# Altium footprint library TriggersLib.PcbLib: 262 footprints (part 7 of 17)
Each footprint in its own frame and in the unit in brackets; x right, y up, seen from the top. Pads: shape width x height; smd on the part's side, far side on the other; paste and mask are expansions set on the pad; w line width, h text height; cw(c..) or ccw(c..) is an arc to the next point about the centre after c.
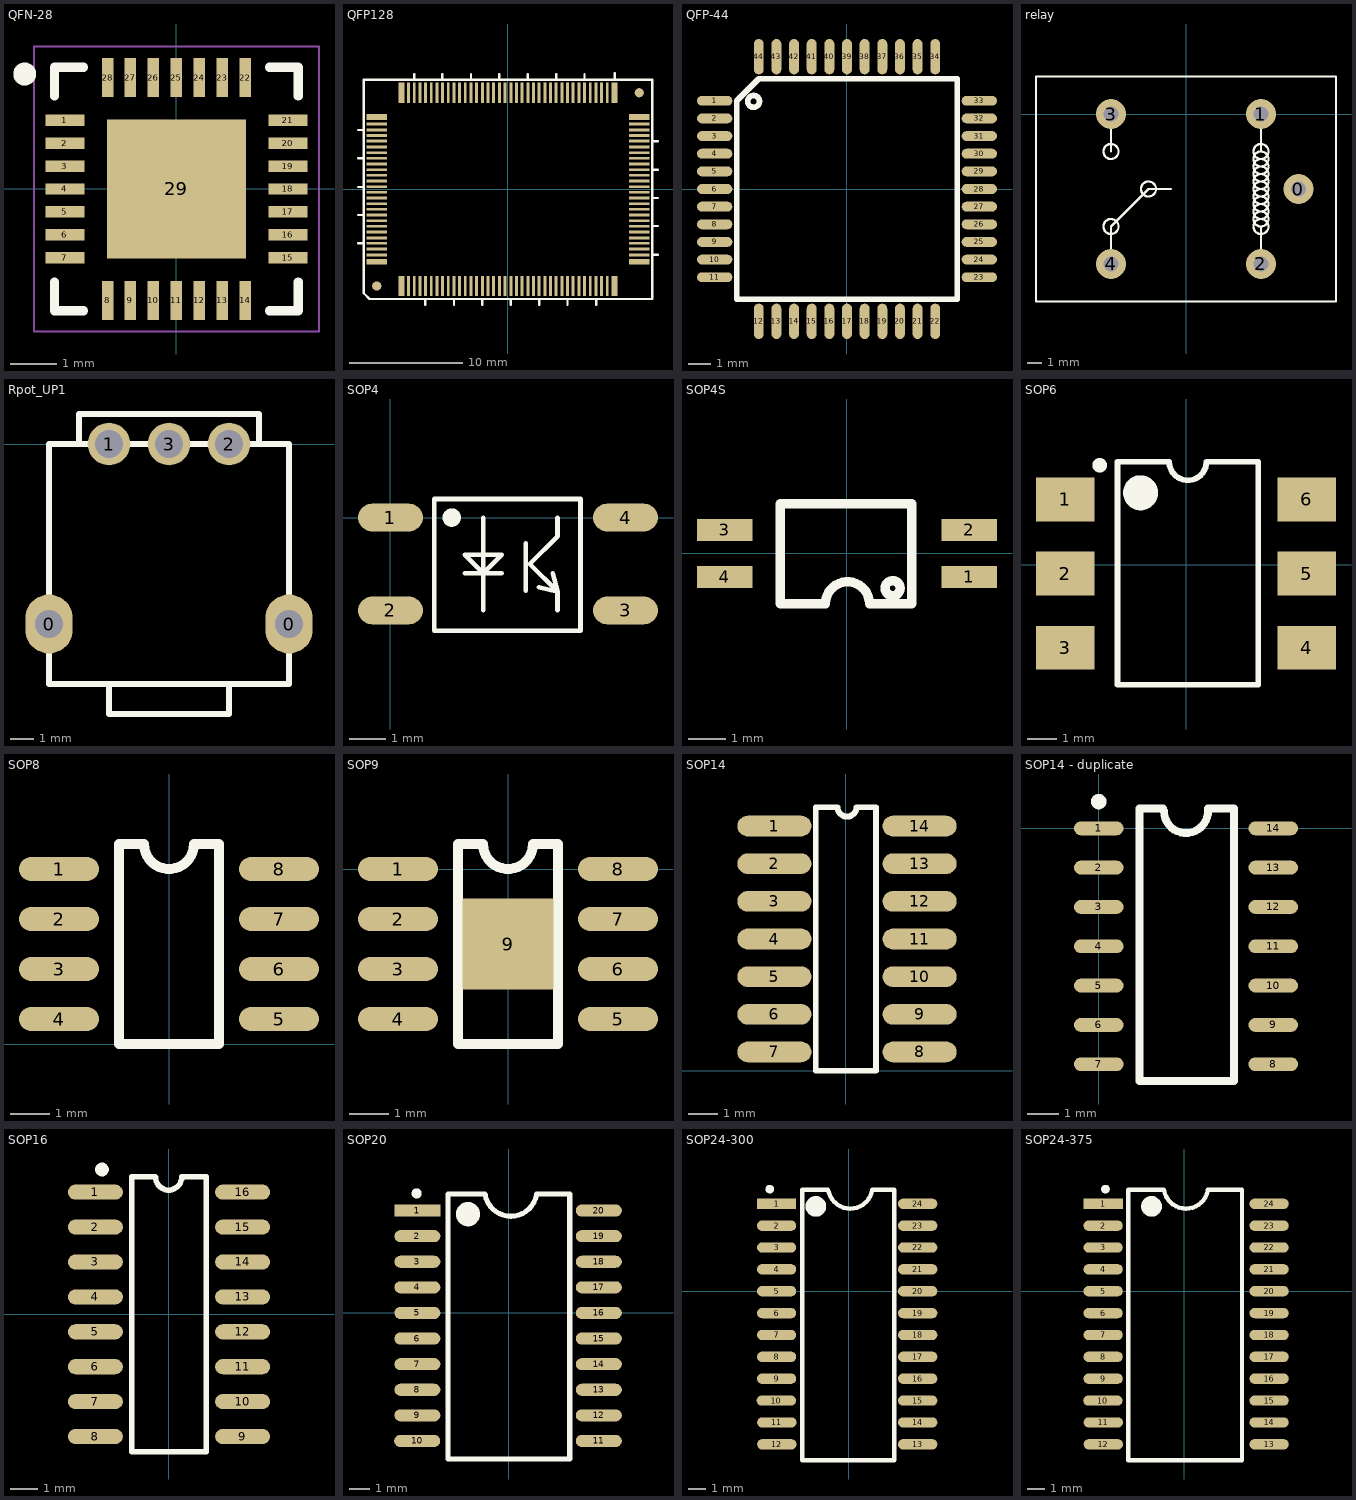
[diagram p6: the footprints below, top view; thin cyan lines are the x and y axes]

## QFN-28 [mm] "QFN, 28-Leads, Body 5.00x5.00mm, Pitch 0.50mm, Thermal Pad 3.03x3.03mm, IPC Medium Density"
height 0.9
pads (29):
  rect 0.85x0.25 smd: 1(-2.425,1.5) 2(-2.425,1) 3(-2.425,0.5) 4(-2.425,0) 5(-2.425,-0.5) 6(-2.425,-1) 7(-2.425,-1.5) 15(2.425,-1.5) 16(2.425,-1) 17(2.425,-0.5) 18(2.425,0) 19(2.425,0.5) 20(2.425,1) 21(2.425,1.5)
  rect 0.25x0.85 smd: 8(-1.5,-2.425) 9(-1,-2.425) 10(-0.5,-2.425) 11(0,-2.425) 12(0.5,-2.425) 13(1,-2.425) 14(1.5,-2.425) 22(1.5,2.425) 23(1,2.425) 24(0.5,2.425) 25(0,2.425) 26(-0.5,2.425) 27(-1,2.425) 28(-1.5,2.425)
  rect 3.03x3.03 smd: 29(0,0)
Top Overlay:
  circle w0.25: c-3.3,2.5 r0.125
  lines w0.2: -2.65,-2.025 -2.65,-2.65 -2.025,-2.65 ; -2.65,2.025 -2.65,2.65 -2.025,2.65 ; 2.025,-2.65 2.65,-2.65 2.65,-2.025 ; 2.025,2.65 2.65,2.65 2.65,2.025
Mechanical 15:
  lines w0.05: -3.1,-3.1 -3.1,3.1 3.1,3.1 3.1,-3.1 -3.1,-3.1
  lines w0.1: -0.5,0 0.5,0 ; 0,-0.5 0,0.5
3D body "User Library-QFN28.STEP": height 0.9, standoff 0, extent -2.5,-2.525 2.54,2.515

## QFP128 [mil]
pads (130):
  rect 20x70 smd: 1(-369,-335) 38(369,-335) 65(369,335) 102(-369,335)
  rect 10x70 smd: 2(-345,-335) 3(-325,-335) 4(-305,-335) 5(-286,-335) 6(-266,-335) 7(-246,-335) 8(-227,-335) 9(-207,-335) 10(-187,-335) 11(-168,-335) 12(-148,-335) 13(-128,-335) 14(-109,-335) 15(-89,-335) 16(-69,-335) 17(-50,-335) 18(-30,-335) 19(-10,-335) 20(10,-335) 21(29,-335) 22(49,-335) 23(69,-335) 24(88,-335) 25(108,-335) 26(128,-335) 27(147,-335) 28(167,-335) 29(187,-335) 30(206,-335) 31(226,-335) 32(246,-335) 33(265,-335) 34(285,-335) 35(305,-335) 36(324,-335) 37(344,-335) 66(344,335) 67(324,335) 68(305,335) 69(285,335) 70(265,335) 71(246,335) 72(226,335) 73(206,335) 74(187,335) 75(167,335) 76(147,335) 77(128,335) 78(108,335) 79(88,335) 80(69,335) 81(49,335) 82(29,335) 83(10,335) 84(-10,335) 85(-30,335) 86(-50,335) 87(-69,335) 88(-89,335) 89(-109,335) 90(-128,335) 91(-148,335) 92(-168,335) 93(-187,335) 94(-207,335) 95(-227,335) 96(-246,335) 97(-266,335) 98(-286,335) 99(-305,335) 100(-325,335) 101(-345,335)
  rect 70x20 smd: 39(455,-251) 64(455,251) 103(-455,251) 128(-455,-251)
  rect 70x10 smd: 40(455,-227) 41(455,-207) 42(455,-187) 43(455,-168) 44(455,-148) 45(455,-128) 46(455,-109) 47(455,-89) 48(455,-69) 49(455,-50) 50(455,-30) 51(455,-10) 52(455,9) 53(455,29) 54(455,49) 55(455,68) 56(455,88) 57(455,108) 58(455,127) 59(455,147) 60(455,167) 61(455,187) 62(455,206) 63(455,226) 104(-455,226) 105(-455,206) 106(-455,187) 107(-455,167) 108(-455,147) 109(-455,127) 110(-455,108) 111(-455,88) 112(-455,68) 113(-455,49) 114(-455,29) 115(-455,9) 116(-455,-10) 117(-455,-30) 118(-455,-50) 119(-455,-69) 120(-455,-89) 121(-455,-109) 122(-455,-128) 123(-455,-148) 124(-455,-168) 125(-455,-187) 126(-455,-207) 127(-455,-227)
  round 32 smd: 129(-455,-335) 130(455,335)
Top Overlay:
  lines w8: -520,-187 -500,-187 ; -520,-89 -500,-89 ; -520,8 -500,8 ; -520,108 -500,108 ; -520,205.5 -500,205.5 ; -325,380 -325,400 ; -287,-400 -287,-380 ; -227.5,380 -227.5,400 ; -187,-400 -187,-380 ; -128,380 -128,400 ; -89.5,-400 -89.5,-380 ; -30,380 -30,400 ; 10,-400 10,-380 ; 69,380 69,400 ; 108,-400 108,-380 ; 167.5,380 167.5,400 ; 206,-400 206,-380 ; 265,380 265,400 ; 305.5,-400 305.5,-380 ; 370,382.5 370,402.5 ; 500,-227 520,-227 ; 500,-127 520,-127 ; 500,-30 520,-30 ; 500,68 520,68 ; 500,167 520,167 ; -500,-360 -500,380 500,380 500,-380 -480,-380 -500,-360
3D body "User Library-QFP5-128.step": height 114.17, standoff 0, extent -457.39,-339.17 456,338

## QFP-44 [mm]
pads (44):
  oval 1.6x0.45 smd: 1(-6,4) 2(-6,3.2) 3(-6,2.4) 4(-6,1.6) 5(-6,0.8) 6(-6,0) 7(-6,-0.8) 8(-6,-1.6) 9(-6,-2.4) 10(-6,-3.2) 11(-6,-4) 23(6,-4) 24(6,-3.2) 25(6,-2.4) 26(6,-1.6) 27(6,-0.8) 28(6,0) 29(6,0.8) 30(6,1.6) 31(6,2.4) 32(6,3.2) 33(6,4)
  oval 0.45x1.6 smd: 12(-4,-6) 13(-3.2,-6) 14(-2.4,-6) 15(-1.6,-6) 16(-0.8,-6) 17(0,-6) 18(0.8,-6) 19(1.6,-6) 20(2.4,-6) 21(3.2,-6) 22(4,-6) 34(4,6) 35(3.2,6) 36(2.4,6) 37(1.6,6) 38(0.8,6) 39(0,6) 40(-0.8,6) 41(-1.6,6) 42(-2.4,6) 43(-3.2,6) 44(-4,6)
Top Overlay:
  circle w0.254: c-4.232,3.972 r0.267
  lines w0.254: -5,-5 5,-5 5,5 -4,5 -5,4 -5,-5
3D body "User Library-44 pin tqfp ic package.STEP": height 1.1, standoff -0.01, extent -5.975,-5.975 6.025,6.025
3D body: height 1.15, standoff 0, extent -4.484,3.489 -3.488,4.487

## relay [mil]
pads (5):
  round 80 hole 40: 0(300,-200) 1(200,0) 2(200,-400) 3(-200,0) 4(-200,-400)
Top Overlay:
  circle w6: c200,-300 r20
  circle w6: c200,-280 r20
  circle w6: c200,-260 r20
  circle w6: c200,-240 r20
  circle w6: c200,-220 r20
  circle w6: c200,-200 r20
  circle w6: c200,-180 r20
  circle w6: c200,-160 r20
  circle w6: c200,-140 r20
  circle w6: c200,-120 r20
  circle w6: c200,-100 r20
  circle w6: c-100,-200 r20
  circle w6: c-200,-300 r20
  circle w6: c-200,-100 r20
  lines w6: -200,-400 -200,-300 -100,-200 -40,-200 ; -200,-100 -200,0 ; 200,-400 200,-300 ; 200,-100 200,0 ; -400,-500 -400,100 400,100 400,-500 -400,-500

## Rpot_UP1 [mm]
pads (5):
  oval 2x2.5 hole 1.2: 0(-20.32,-7.62) 0(-10.16,-7.62)
  round 1.8 hole 1.2: 1(-17.78,0) 2(-12.7,0) 3(-15.24,0)
Top Overlay:
  lines w0.254: -19.05,0 -19.05,1.27 -11.43,1.27 -11.43,0 ; -17.78,-10.16 -17.78,-11.43 -13.97,-11.43 -12.7,-11.43 -12.7,-10.16 ; -20.32,-10.16 -20.32,0 -10.16,0 -10.16,-10.16 -20.32,-10.16

## SOP4 [mil] "AQY211G2S"
pads (4):
  oval 70x30 smd: 1(0,0) 2(0,-100) 3(253.23,-100) 4(253.23,0)
Top Overlay:
  circle w10: c65.94,0 r4.92
  lines w5: 80,-60 120,-60 ; 100,-100 100,0 ; 145.67,-78.74 145.67,-27.56 ; 160,-75 180,-80 ; 175,-60 180,-80 ; 180,-100 180,-80 ; 180,0 180,-20 150,-50 180,-80 ; 47.24,-121.73 47.24,20 204.72,20 204.72,-121.73 47.24,-121.73 ; 80,-40 120,-40 100,-60 80,-40
3D body "User Library-HCPL-181-1.STEP": height 78.74, standoff -3.96, extent -7.87,-122.05 267.72,19.69

## SOP4S [mm]
pads (4):
  rect 1.5x0.6 smd: 1(3.31,-0.635) 2(3.31,0.635) 3(-3.309,0.635) 4(-3.309,-0.635)
Top Overlay:
  circle w0.254: c1.235,-0.94 r0.203
  lines w0.254: -1.805,-1.361 -1.805,1.346 ; -1.794,-1.361 -0.582,-1.361 cw(c0.013,-1.361) 0.608,-1.361 1.751,-1.361 1.751,1.346 -1.786,1.346
3D body "SOP-4-1.step": height 2.1, standoff 0, extent -3.492,-1.397 3.507,1.403

## SOP6 [mm]
pads (6):
  rect 2x1.5 smd: 1(-4.14,2.235) 2(-4.14,-0.305) 3(-4.14,-2.845) 4(4.14,-2.845) 5(4.14,-0.305) 6(4.14,2.235)
Top Overlay:
  circle w0.6: c-1.557,2.464 r0.3
  circle w0.25: c-2.957,3.404 r0.125
  lines w0.2: -2.349,-4.115 2.476,-4.115 2.476,3.524 0.699,3.524 cw(c0.064,3.524) -0.572,3.524 -2.349,3.524 -2.349,-4.115
3D body "User Library-SOP-6.step": height 4, standoff -0.08, extent -4.532,-4.548 4.633,3.962

## SOP8 [mil]
pads (8):
  oval 80x24 smd: 1(-110,175) 2(-110,125) 3(-110,75) 4(-110,25) 5(110,25) 6(110,75) 7(110,125) 8(110,175)
Top Overlay:
  lines w10: -50,0 50,0 50,200 25,200 cw(c0,200) -25,200 -50,200 -50,0
3D body "SOP8.STEP": height 62.99, standoff 0, extent -117.7,2.38 120.17,200.02

## SOP9 [mil]
pads (9):
  oval 80x24 smd: 1(-110.24,0) 2(-110.24,-50) 3(-110.24,-100) 4(-110.24,-150) 5(109.76,-150) 6(109.76,-100) 7(109.76,-50) 8(109.76,0)
  rect 90.55x90.55 smd: 9(-0.24,-75)
Top Overlay:
  lines w10: -50.24,-175 49.76,-175 49.76,25 24.76,25 cw(c-0.24,25) -25.24,25 -50.24,25 -50.24,-175
3D body "User Library-sop-8.STEP": height 62.99, standoff 0, extent -119.17,-173.82 118.69,23.82

## SOP14 [mm]
pads (14):
  oval 2.5x0.7 smd: 1(-2.413,8.255) 2(-2.413,6.985) 3(-2.413,5.715) 4(-2.413,4.445) 5(-2.413,3.175) 6(-2.413,1.905) 7(-2.413,0.635) 8(2.487,0.635) 9(2.487,1.905) 10(2.487,3.175) 11(2.487,4.445) 12(2.487,5.715) 13(2.487,6.985) 14(2.487,8.255)
Top Overlay:
  lines w0.2: -1.016,0 1.016,0 1.016,8.89 0.355,8.89 cw(c0.037,8.89) -0.28,8.89 -1.016,8.89 -1.016,0

## SOP14 - duplicate [mm] "LM339"
height 1.8
pads (14):
  oval 1.6x0.45 smd mask+0.1: 1(0,0) 2(0,-1.27) 3(0,-2.54) 4(0,-3.81) 5(0,-5.08) 6(0,-6.35) 7(0,-7.62) 8(5.639,-7.62) 9(5.639,-6.35) 10(5.639,-5.08) 11(5.639,-3.81) 12(5.639,-2.54) 13(5.639,-1.27) 14(5.639,0)
Top Overlay:
  circle w0.25: c0.002,0.864 r0.125
  lines w0.254: 2.082,0.641 1.32,0.641 1.32,-8.159 4.37,-8.159 4.37,0.641 3.531,0.641 ; 2.108,0.559 ccw(c2.819,0.559) 3.53,0.583
3D body "SOP14.STEP": height 1.61, standoff 0, extent -0.306,-8.16 5.894,0.54

## SOP16 [mm] "SOP, 16-Leads, Body 9.90x3.90mm, Pitch 1.27mm, IPC Medium Density"
height 1.75
pads (16):
  oval 2x0.55 smd: 1(-2.667,4.445) 2(-2.667,3.175) 3(-2.667,1.905) 4(-2.667,0.635) 5(-2.667,-0.635) 6(-2.667,-1.905) 7(-2.667,-3.175) 8(-2.667,-4.445) 9(2.692,-4.445) 10(2.692,-3.175) 11(2.692,-1.905) 12(2.692,-0.635) 13(2.692,0.635) 14(2.692,1.905) 15(2.692,3.175) 16(2.692,4.445)
Top Overlay:
  circle w0.25: c-2.425,5.27 r0.125
  lines w0.2: -0.483,5 -1.346,5 -1.346,-5 1.372,-5 1.372,5 0.475,5 ; -0.475,4.997 ccw(c0,4.996) 0.475,4.997
3D body "SO-16.step": height 1.45, standoff 0, extent -2.927,-4.978 2.978,5.004

## SOP20 [mm]
height 2.36
pads (20):
  rect 2.286x0.6 smd: 1(-4.534,5.08)
  oval 2.286x0.6 smd: 2(-4.534,3.81) 3(-4.534,2.54) 4(-4.534,1.27) 5(-4.534,0) 6(-4.534,-1.27) 7(-4.534,-2.54) 8(-4.534,-3.81) 9(-4.534,-5.08) 10(-4.544,-6.35) 11(4.465,-6.35) 12(4.465,-5.08) 13(4.465,-3.81) 14(4.465,-2.54) 15(4.465,-1.27) 16(4.465,0) 17(4.465,1.27) 18(4.465,2.54) 19(4.465,3.81) 20(4.465,5.08)
Top Overlay:
  circle w0.25: c-4.575,5.93 r0.125
  circle w0.6: c-2.025,4.9 r0.3
  lines w0.254: -1.194,5.9 -3.025,5.9 -3.025,-7.239 3.025,-7.239 3.025,5.9 1.372,5.9 ; -1.17,5.844 ccw(c0.101,6.094) 1.372,5.842
3D body "User Library-SO-20 (Wide).step": height 2.7, standoff 0, extent -5.15,-7.009 5.15,5.791

## SOP24-300 [mil]
height 92.91
pads (24):
  rect 90x23.62 smd: 1(-164.5,200)
  oval 90x23.62 smd: 2(-164.5,150) 3(-164.5,100) 4(-164.5,50) 5(-164.5,0) 6(-164.5,-50) 7(-164.5,-100) 8(-164.5,-150) 9(-164.5,-200) 10(-164.9,-250) 11(-164,-300) 12(-164,-350) 13(158,-350) 14(158,-300) 15(158,-250) 16(158,-200) 17(158,-150) 18(158,-100) 19(158,-50) 20(158,0) 21(158,50) 22(158,100) 23(158,150) 24(158,200)
Top Overlay:
  circle w23.62: c-74.81,194 r11.81
  circle w9.84: c-180.12,233.46 r4.92
  lines w10: -47,232.28 -106,232.28 -106,-386 105,-386 105,232.28 54,232.28 ; -46.07,230.07 ccw(c3.97,239.91) 54,230

## SOP24-375 [mil]
height 92.91
pads (24):
  rect 90x23.62 smd: 1(-185.5,200)
  oval 90x23.62 smd: 2(-185.5,150) 3(-185.5,100) 4(-185.5,50) 5(-185.5,0) 6(-185.5,-50) 7(-185.5,-100) 8(-185.5,-150) 9(-185.5,-200) 10(-185.9,-250) 11(-185,-300) 12(-185,-350) 13(194,-350) 14(194,-300) 15(194,-250) 16(194,-200) 17(194,-150) 18(194,-100) 19(194,-50) 20(194,0) 21(194,50) 22(194,100) 23(194,150) 24(194,200)
Top Overlay:
  circle w9.84: c-180.12,233.46 r4.92
  circle w23.62: c-74.81,194 r11.81
  lines w10: -47,232.28 -128,232.28 -128,-386 132,-386 132,232.28 54,232.28 ; -46.07,230.07 ccw(c3.97,239.91) 54,230
3D body "SOP24.STEP": height 74.8, standoff 1.06, extent -203,-383.99 209,234